# Altium footprint library Hare_Library.PcbLib: 252 footprints (part 13 of 16)
Each footprint in its own frame and in the unit in brackets; x right, y up, seen from the top. Pads: shape width x height; smd on the part's side, far side on the other; paste and mask are expansions set on the pad; w line width, h text height; cw(c..) or ccw(c..) is an arc to the next point about the centre after c.
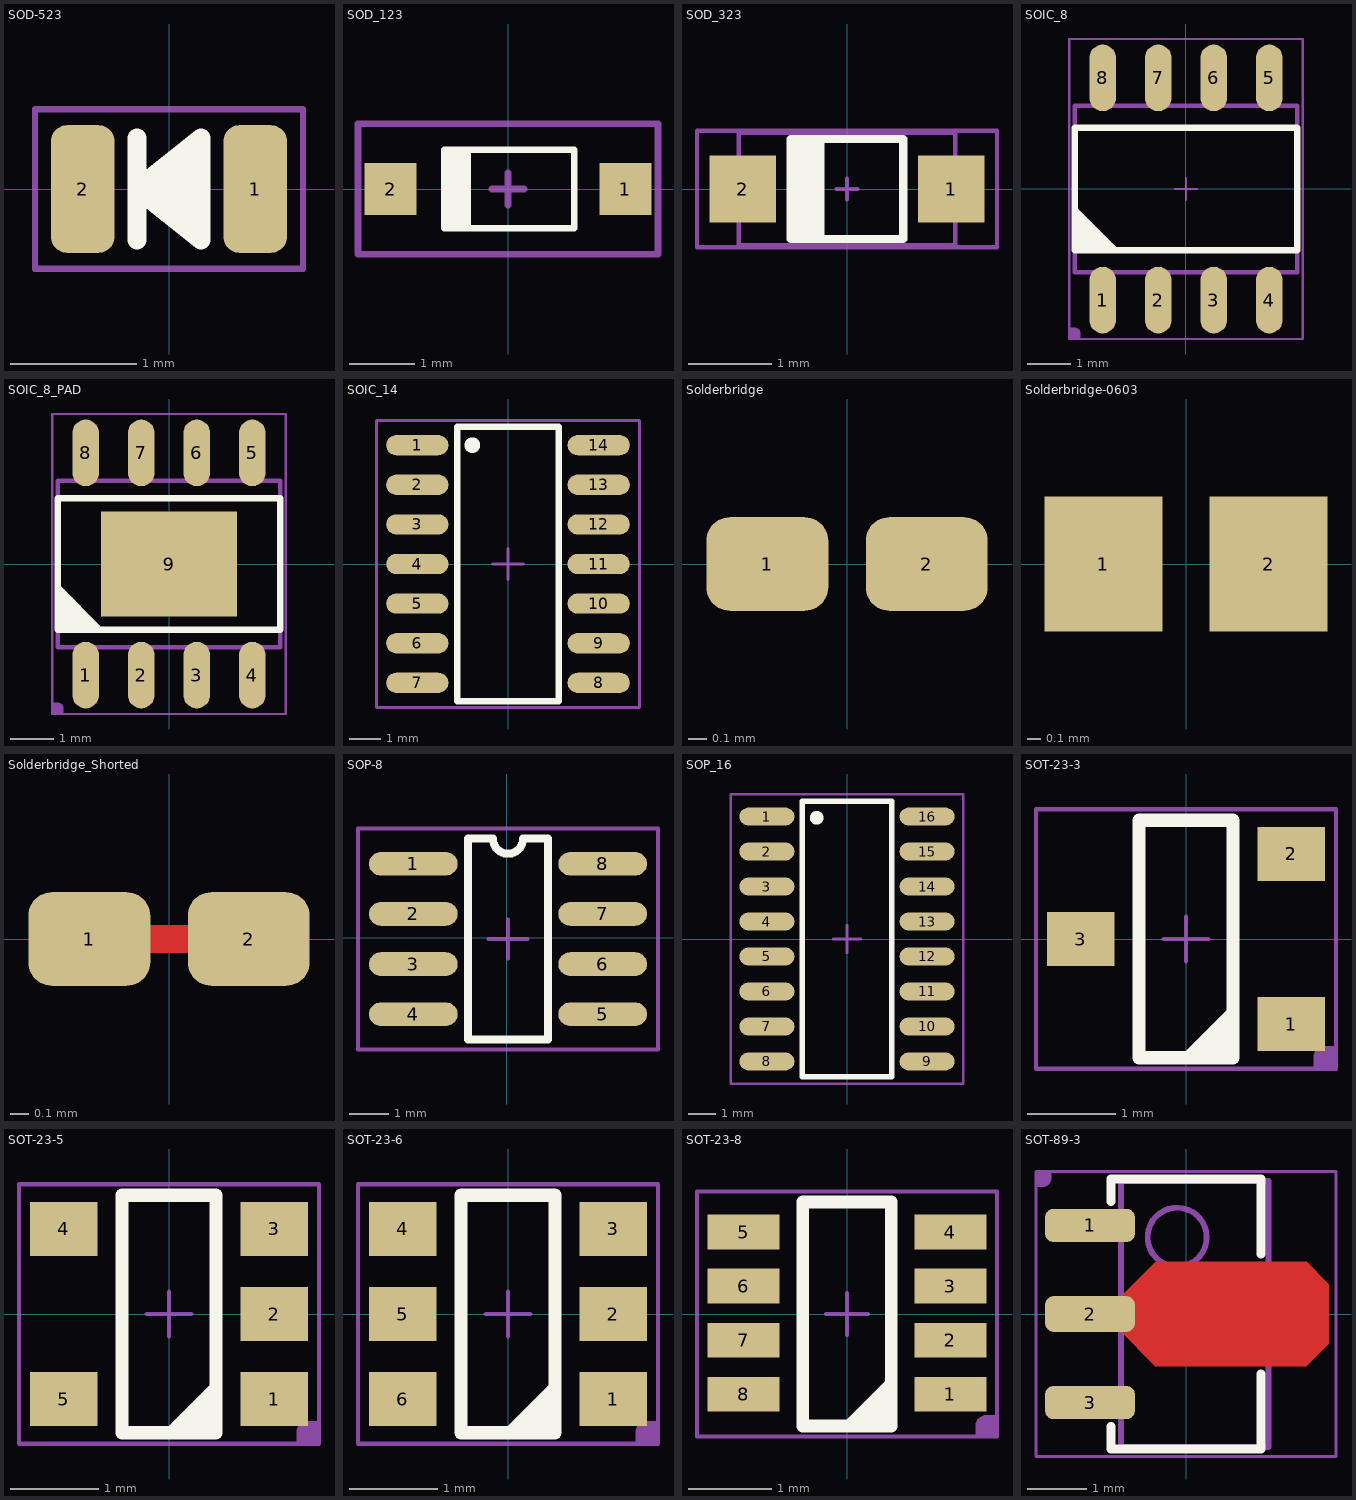
[diagram p12: the footprints below, top view; thin cyan lines are the x and y axes]

## SOD-523 [mil]
height 45.28
pads (2):
  rrect50% 20x40 smd: 1(27,0) 2(-27,0)
Top Overlay:
  region: 10,-16 10,16 -10,0
  lines w6: -10,-16 -10,16 ; -10,0 10,16 10,-16 -10,0
Mechanical 13:
  lines w2: -10,0 10,0 ; 0,-10 0,10
Mechanical 14:
  lines w2: -42,-25 42,-25 42,25 -42,25 -42,-25
3D body "User Library-SOD-523F.STEP": height 27.56, standoff 0, extent -31.5,-15.7 31.5,15.7

## SOD_123 [mm]
pads (2):
  rect 0.8x0.8 smd: 1(1.8,0) 2(-1.8,0)
Top Overlay:
  region: -1.025,-0.6 -1.025,0.6 -0.575,0.6 -0.575,-0.6
  lines w0.1: -0.975,-0.6 1.016,-0.6 1.016,0.6 -0.975,0.6
Mechanical 15:
  lines w0.1: -0.25,0 0.25,0 ; 0,-0.25 0,0.25 ; -2.3,-1 2.3,-1 2.3,1 -2.3,1 -2.3,-1
3D body "User Library-SOD-123_DiodesInc.STEP": height 1.42, standoff -0.03, extent -1.95,-0.85 1.9,0.85

## SOD_323 [mm]
pads (2):
  rect 0.8x0.8 smd: 1(1.25,0) 2(-1.25,0)
Top Overlay:
  region: -0.725,-0.6 -0.725,0.6 -0.275,0.6 -0.275,-0.6
  lines w0.1: -0.675,-0.6 0.675,-0.6 0.675,0.6 -0.675,0.6
Mechanical 13:
  lines w0.051: -0.127,0 0.127,0 ; 0,-0.127 0,0.127 ; -1.3,-0.675 -1.3,0.675 1.3,0.675 1.3,-0.675 -1.3,-0.675
Mechanical 14:
  lines w0.051: -1.8,-0.7 -1.8,0.7 1.8,0.7 1.8,-0.7 -1.8,-0.7
3D body "User Library-SOD323-1.STEP": height 1.1, standoff 0, extent -1.3,-0.675 1.3,0.675

## SOIC_8 [mil]
pads (8):
  oval 24x60 smd: 1(-75,-100.02) 2(-25,-100.02) 3(25,-100.02) 4(75,-100.02) 5(75,99.98) 6(25,99.98) 7(-25,99.98) 8(-75,99.98)
Top Overlay:
  region: -100,-55.02 -100,-15.02 -60,-55.02
  lines w6: -100,-55.02 -100,54.98 100,54.98 100,-55.02 -100,-55.02
Mechanical 13:
  lines w2: -10,-0.02 10,-0.02 ; 0,-10.02 0,9.98
  lines w4: -100,-75.02 100,-75.02 100,74.98 -100,74.98 -100,-75.02
Mechanical 14:
  region: -105,-135.02 -105,-125.02 -100,-125.02 -99,-125.02 -97.16,-125.78 -95.76,-127.18 -95,-129.02 -95,-130.02 -95,-135.02
  lines w2: -105,-135.02 105,-135.02 105,134.98 -105,134.98 -105,-135.02
3D body "User Library-SOIC-8-1.STEP": height 68.9, standoff 0, extent -96.45,-118.12 96.46,118.1

## SOIC_8_PAD [mil]
pads (9):
  oval 24x60 smd: 1(-75,-100) 2(-25,-100) 3(25,-100) 4(75,-100) 5(75,100) 6(25,100) 7(-25,100) 8(-75,100)
  rect 122.05x94.49 smd: 9(0,0)
Top Overlay:
  region: -99.41,-58.07 -99.41,-18.07 -59.41,-58.07
  lines w6: -100,-59.06 -100,59.06 100,59.06 100,-59.06 -100,-59.06
Mechanical 13:
  lines w2: -10,0 10,0 ; 0,-10 0,10
  lines w4: -100,-75 100,-75 100,75 -100,75 -100,-75
Mechanical 14:
  region: -105,-135 -105,-125 -100,-125 -99.01,-125 -97.17,-125.76 -95.76,-127.17 -95,-129.01 -95,-130 -95,-135
  lines w2: -105,-135 105,-135 105,135 -105,135 -105,-135
3D body "SOIC_8_PAD.STEP": height 71.06, standoff -0.13, extent -98.43,-118.08 98.42,118.08

## SOIC_14 [mm]
height 1.75
pads (14):
  oval 2x0.65 smd: 1(-2.906,3.81) 2(-2.906,2.54) 3(-2.906,1.27) 4(-2.906,0) 5(-2.906,-1.27) 6(-2.906,-2.54) 7(-2.906,-3.81) 8(2.906,-3.81) 9(2.906,-2.54) 10(2.906,-1.27) 11(2.906,0) 12(2.906,1.27) 13(2.906,2.54) 14(2.906,3.81)
Top Overlay:
  circle w0.25: c-1.143,3.81 r0.125
  lines w0.2: -1.626,-4.4 -1.626,4.4 1.626,4.4 1.626,-4.4 -1.626,-4.4
Mechanical 15:
  lines w0.1: -0.5,0 0.5,0 ; 0,-0.5 0,0.5 ; -4.216,-4.6 4.216,-4.6 4.216,4.6 -4.216,4.6 -4.216,-4.6
3D body "SOIC_14.STEP": height 1.66, standoff -0.02, extent -3.011,-4.3 3.01,4.3

## Solderbridge [mil]
pads (2):
  rrect50% 26x20 smd: 1(-17,0) 2(17,0)
Top Solder:
  region: 25,12 -25,12 -26.39,12 -28.96,10.94 -30.94,8.97 -32,6.39 -32,5 -32,-5 -32,-6.39 -30.94,-8.97 -28.97,-10.94 -26.39,-12 -25,-12 25,-12 26.39,-12 28.96,-10.94 30.93,-8.97 32,-6.39 32,-5 32,5 32,6.39 30.93,8.96 28.96,10.93 26.39,12

## Solderbridge-0603 [mil]
pads (2):
  rect 35x40 smd: 1(-24.5,0) 2(24.5,0)

## Solderbridge_Shorted [mil]
pads (2):
  rrect50% 26x20 smd: 1(-17,0) 2(17,0)
Top Layer:
  lines w6: -17,0 17,0
Top Solder:
  region: 25,12 -25,12 -26.39,12 -28.96,10.94 -30.94,8.97 -32,6.39 -32,5 -32,-5 -32,-6.39 -30.94,-8.97 -28.97,-10.94 -26.39,-12 -25,-12 25,-12 26.39,-12 28.96,-10.94 30.93,-8.97 32,-6.39 32,-5 32,5 32,6.39 30.93,8.96 28.96,10.93 26.39,12

## SOP-8 [mm]
pads (8):
  oval 2.25x0.6 smd: 1(-2.375,1.88) 2(-2.375,0.61) 3(-2.375,-0.66) 4(-2.375,-1.93) 5(2.425,-1.93) 6(2.425,-0.66) 7(2.425,0.61) 8(2.425,1.88)
Top Overlay:
  lines w0.203: -0.37,2.525 -0.991,2.525 -0.991,-2.575 1.041,-2.575 1.041,2.525 0.406,2.525 ; -0.356,2.515 ccw(c0.025,2.515) 0.406,2.515
Mechanical 15:
  lines w0.1: -0.475,-0.025 0.525,-0.025 ; 0.025,-0.525 0.025,0.475 ; -3.775,-2.825 -3.775,2.775 3.825,2.775 3.825,-2.825 -3.775,-2.825
3D body "User Library-sop-8.SLDPRT": height 1.6, standoff 0, extent -2.97,-2.561 3.072,2.459

## SOP_16 [mm]
height 1.75
pads (16):
  oval 2x0.65 smd: 1(-2.906,4.445) 2(-2.906,3.175) 3(-2.906,1.905) 4(-2.906,0.635) 5(-2.906,-0.635) 6(-2.906,-1.905) 7(-2.906,-3.175) 8(-2.906,-4.445) 9(2.906,-4.445) 10(2.906,-3.175) 11(2.906,-1.905) 12(2.906,-0.635) 13(2.906,0.635) 14(2.906,1.905) 15(2.906,3.175) 16(2.906,4.445)
Top Overlay:
  circle w0.25: c-1.1,4.4 r0.125
  lines w0.2: -1.626,-5 1.626,-5 1.626,5 -1.626,5 -1.626,-5
Mechanical 15:
  lines w0.1: -0.5,0 0.5,0 ; 0,-0.5 0,0.5 ; -4.216,-5.25 4.216,-5.25 4.216,5.25 -4.216,5.25 -4.216,-5.25
3D body "SOIC_16.STEP": height 1.48, standoff -0.01, extent -3.055,-5 3.056,5

## SOT-23-3 [mil]
height 39.5
pads (3):
  rect 30x24 smd: 1(47,-38) 2(47,38) 3(-47,0)
Top Overlay:
  region: 21,-53 -3,-53 21,-29
  lines w6: -21,-53 -21,53 21,53 21,-53 -21,-53
Mechanical 13:
  lines w2: -10,0 10,0 ; 0,-10 0,10
Mechanical 14:
  region: 67,-58 57,-58 57,-53 57,-52.01 57.76,-50.17 59.17,-48.76 61.01,-48 62,-48 67,-48
  lines w2: -67,-58 67,-58 67,58 -67,58 -67,-58
3D body "User Library-SOT23-3.STEP": height 51.18, standoff 0, extent -55.12,-57.09 55.11,57.09

## SOT-23-5 [mil]
height 62.99
pads (5):
  rect 30x24 smd: 1(47,-38) 2(47,0) 3(47,38) 4(-47,38) 5(-47,-38)
Top Overlay:
  region: 21,-53 -3,-53 21,-29
  lines w6: -21,-53 -21,53 21,53 21,-53 -21,-53
Mechanical 13:
  lines w2: -10,0 10,0 ; 0,-10 0,10
Mechanical 14:
  region: 67,-58 57,-58 57,-53 57,-52.01 57.76,-50.17 59.17,-48.76 61.01,-48 62,-48 67,-48
  lines w2: -67,-58 67,-58 67,58 -67,58 -67,-58
3D body "User Library-SOT23-5-2.STEP": height 57.09, standoff 0, extent -55.12,-57.09 55.11,57.09

## SOT-23-6 [mil]
height 62.99
pads (6):
  rect 30x24 smd: 1(47,-38) 2(47,0) 3(47,38) 4(-47,38) 5(-47,0) 6(-47,-38)
Top Overlay:
  region: 21,-53 -3,-53 21,-29
  lines w6: -21,-53 21,-53 21,53 -21,53 -21,-53
Mechanical 13:
  lines w2: -10,0 10,0 ; 0,-10 0,10
Mechanical 14:
  region: 67,-58 57,-58 57,-53 57,-52.01 57.76,-50.17 59.17,-48.76 61.01,-48 62,-48 67,-48
  lines w2: -67,-58 67,-58 67,58 -67,58 -67,-58
3D body "User Library-SOT23-6-2.STEP": height 57.09, standoff 0, extent -55.12,-57.09 55.11,57.09

## SOT-23-8 [mm]
pads (8):
  rect 0.862x0.42 smd: 1(1.244,-0.965) 2(1.244,-0.315) 3(1.244,0.335) 4(1.244,0.985) 5(-1.244,0.985) 6(-1.244,0.335) 7(-1.244,-0.315) 8(-1.244,-0.965)
Top Overlay:
  region: 0.533,-1.346 -0.076,-1.346 0.533,-0.737
  lines w0.152: -0.533,-1.346 -0.533,1.346 0.533,1.346 0.533,-1.346 -0.533,-1.346
Mechanical 13:
  lines w0.051: -0.254,0 0.254,0 ; 0,-0.254 0,0.254
Mechanical 14:
  region: 1.803,-1.473 1.549,-1.473 1.549,-1.346 1.549,-1.321 1.569,-1.274 1.604,-1.239 1.651,-1.219 1.676,-1.219 1.803,-1.219
  lines w0.051: -1.803,-1.473 -1.803,1.473 1.803,1.473 1.803,-1.473 -1.803,-1.473
3D body "sot-23-8.step": height 1.2, standoff 0, extent -1.406,-1.435 1.394,1.505

## SOT-89-3 [mil]
height 59.06
pads (3):
  rrect50% 60x22 smd: 1(-64,59.06) 3(-64,-59.06)
  rrect50% 60x24 smd: 2(-64,0)
Top Layer:
  region: -45,10 -20,35 80,35 95,20 95,-20 80,-35 -20,-35 -45,-10
Top Overlay:
  lines w6: -50,-75 -50,-90 50,-90 50,-40 ; -50,75 -50,90 50,90 50,40
Mechanical 13:
  circle w3.94: c-5.91,51.18 r19.68
  lines w3.94: -13.78,0 25.59,0 ; 5.91,-19.69 5.91,19.68 ; -43.31,-88.58 55.12,-88.58 55.12,88.58 -43.31,88.58 -43.31,-88.58
Mechanical 14:
  region: -100,95 -90,95 -90,90 -90,89.01 -90.76,87.17 -92.17,85.76 -94.01,85 -95,85 -100,85
  lines w2: -100,-95 100,-95 100,95 -100,95 -100,-95
3D body "SOT89-150P410X150-3N.step": height 60.06, standoff 1, extent -82.67,-88.44 74.81,88.45